# Altium footprint library TarabusLib_KAP.PcbLib: 504 footprints (part 18 of 32)
Each footprint in its own frame and in the unit in brackets; x right, y up, seen from the top. Pads: shape width x height; smd on the part's side, far side on the other; paste and mask are expansions set on the pad; w line width, h text height; cw(c..) or ccw(c..) is an arc to the next point about the centre after c.
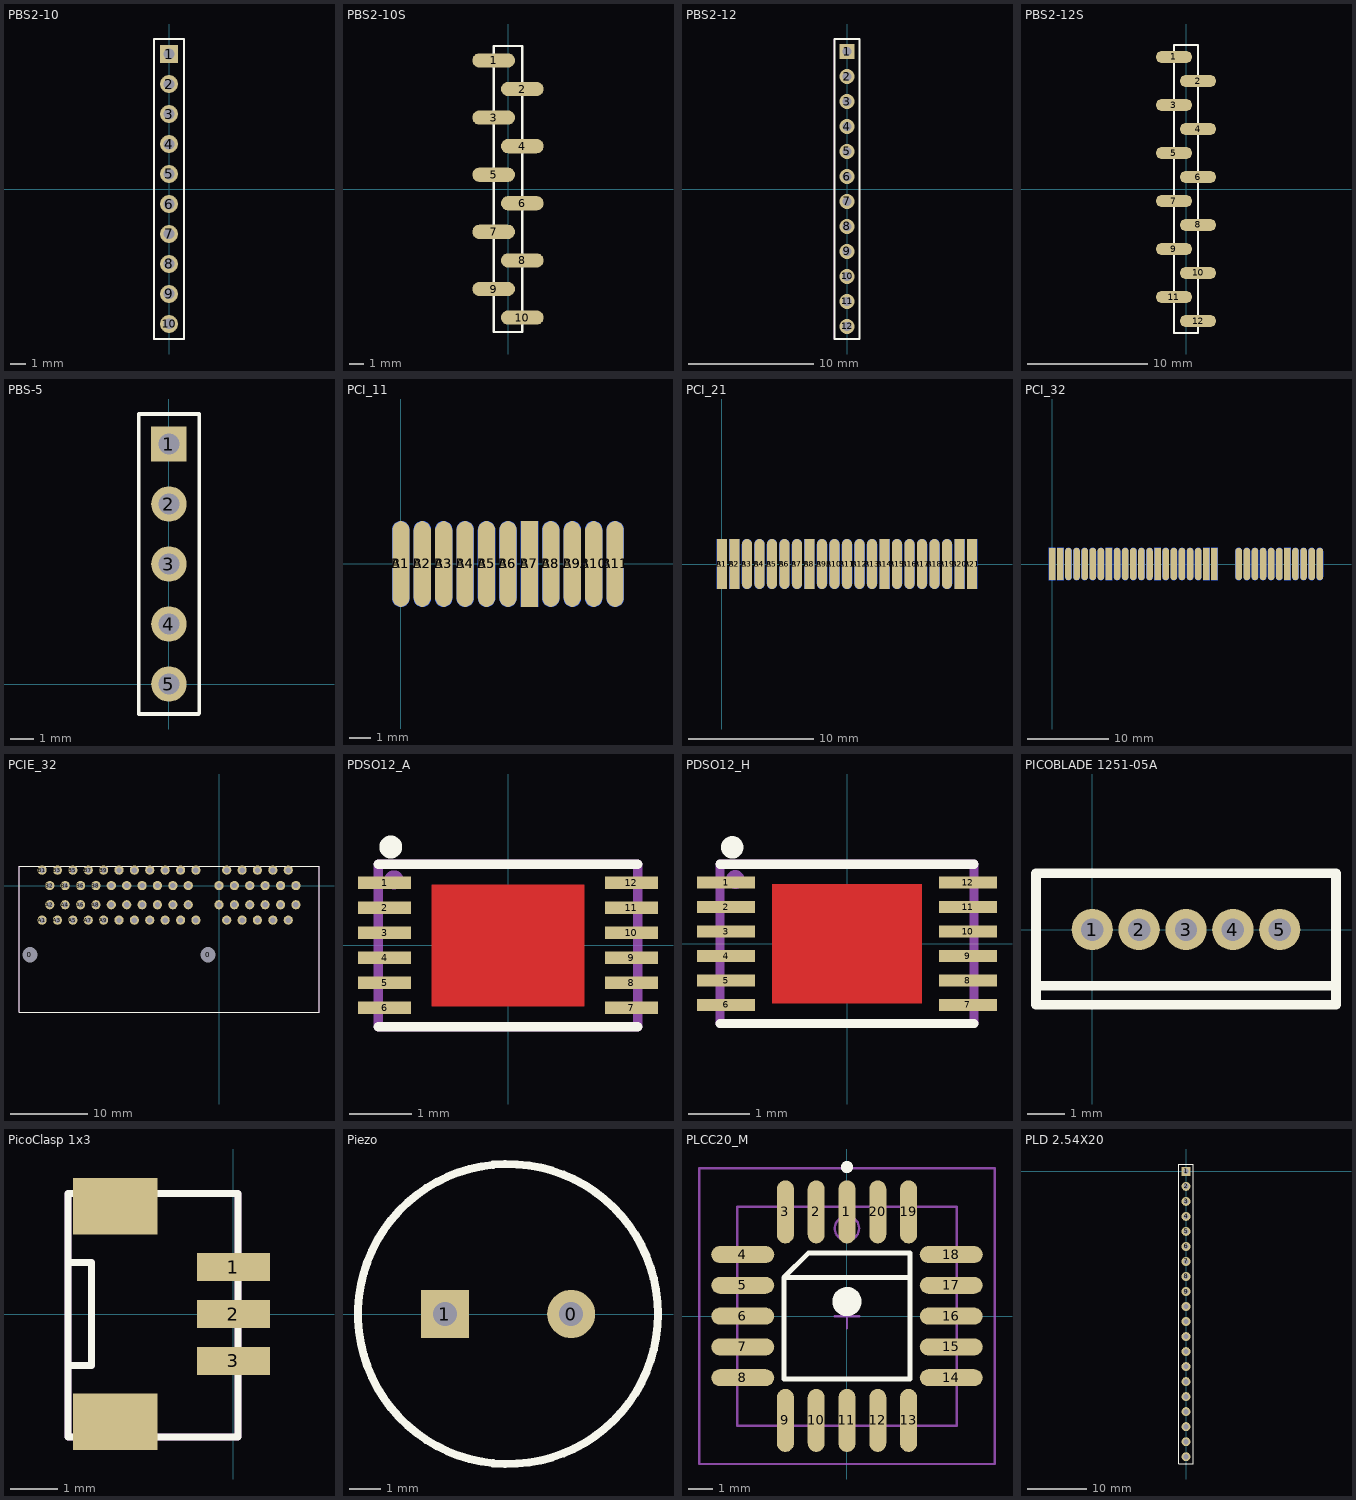
[diagram p17: the footprints below, top view; thin cyan lines are the x and y axes]

## PBS2-10 [mm]
height 4.5
pads (10):
  rect 1.2x1.2 hole 0.7: 1(0,9)
  round 1.2 hole 0.7: 2(0,7) 3(0,5) 4(0,3) 5(0,1) 6(0,-1) 7(0,-3) 8(0,-5) 9(0,-7) 10(0,-9)
Top Overlay:
  lines w0.15: -1,-10 -1,10 1,10 1,-10 -1,-10
Mechanical 7:
  lines w0.1: -1,-10 1,-10 1,10 -1,10 -1,-10
Mechanical 10:
  text ".Comment" at -0.575,10.475 h0.6
  text ".Designator" at -0.575,11.15 h0.8
3D body: height 4.5, standoff 0, extent -1,-10 1,10

## PBS2-10S [mm]
height 4.5
pads (10):
  oval 3x1 smd: 1(-1,9) 2(1,7) 3(-1,5) 4(1,3) 5(-1,1) 6(1,-1) 7(-1,-3) 8(1,-5) 9(-1,-7) 10(1,-9)
Top Overlay:
  lines w0.15: -1,-10 -1,10 1,10 1,-10 -1,-10
Mechanical 7:
  lines w0.1: -1,-10 1,-10 1,10 -1,10 -1,-10
Mechanical 10:
  text ".Comment" at -0.575,10.475 h0.6
  text ".Designator" at -0.575,11.15 h0.8
3D body: height 4.5, standoff 0, extent -1,-10 1,10

## PBS2-12 [mm]
height 4.5
pads (12):
  rect 1.2x1.2 hole 0.7: 1(0,11)
  round 1.2 hole 0.7: 2(0,9) 3(0,7) 4(0,5) 5(0,3) 6(0,1) 7(0,-1) 8(0,-3) 9(0,-5) 10(0,-7) 11(0,-9) 12(0,-11)
Top Overlay:
  lines w0.15: -1,-12 1,-12 1,12 -1,12 -1,-12
Mechanical 7:
  lines w0.1: -1,-12 1,-12 1,12 -1,12 -1,-12
Mechanical 10:
  text ".Designator" at -0.575,13.15 h0.8
  text ".Comment" at -0.575,12.475 h0.6
3D body: height 4.5, standoff 0, extent -1,-12 1,12

## PBS2-12S [mm]
height 4.5
pads (12):
  oval 3x1 smd: 1(-1,11) 2(1,9) 3(-1,7) 4(1,5) 5(-1,3) 6(1,1) 7(-1,-1) 8(1,-3) 9(-1,-5) 10(1,-7) 11(-1,-9) 12(1,-11)
Top Overlay:
  lines w0.15: -1,-12 -1,12 1,12 1,-12 -1,-12
Mechanical 7:
  lines w0.1: -1,-12 -1,12 1,12 1,-12 -1,-12
Mechanical 10:
  text ".Comment" at -0.575,12.475 h0.6
  text ".Designator" at -0.575,13.15 h0.8
3D body: height 4.5, standoff 0, extent -1,-12 1,12

## PBS-5 [mm]
height 8.4
pads (5):
  rect 1.5x1.5 hole 0.9: 1(0,10.16)
  round 1.5 hole 0.9: 2(0,7.62) 3(0,5.08) 4(0,2.54) 5(0,0)
Top Overlay:
  lines w0.15: -1.27,-1.27 1.27,-1.27 ; -1.27,-1.245 -1.27,11.43 1.275,11.43 1.275,-1.245
Mechanical 7:
  lines w0.1: -1.27,-1.245 1.275,-1.245 1.275,11.43 -1.27,11.43 -1.27,-1.245
Mechanical 10:
  text ".Comment" at 0.84,11.97 h0.6
  text ".Designator" at 0.73,12.7 h0.8
3D body "User Library-RM254_5pin.step": height 6.02, standoff -3.1, extent -1.265,-1.27 1.275,11.43

## PCI_11 [mm]
pads (22):
  oval 0.8x4 smd: A1(0,0) A2(1,0) A3(2,0) A4(3,0) A5(4,0) A6(5,0) A8(7,0) A9(8,0) A10(9,0) A11(10,0)
  rect 0.8x4 smd: A7(6,0)
  oval 0.8x4 smd far side: B1(0,0) B2(1,0) B3(2,0) B4(3,0) B5(4,0) B6(5,0) B8(7,0) B9(8,0) B10(9,0) B11(10,0)
  rect 0.8x4 smd far side: B7(6,0)

## PCI_21 [mm]
pads (42):
  rect 0.8x4 smd: A1(0,0) A2(1,0) A8(7,0) A14(13,0) A20(19,0) A21(20,0)
  oval 0.8x4 smd: A3(2,0) A4(3,0) A5(4,0) A6(5,0) A7(6,0) A9(8,0) A10(9,0) A11(10,0) A12(11,0) A13(12,0) A15(14,0) A16(15,0) A17(16,0) A18(17,0) A19(18,0)
  rect 0.8x4 smd far side: B1(0,0) B2(1,0) B8(7,0) B14(13,0) B20(19,0) B21(20,0)
  oval 0.8x4 smd far side: B3(2,0) B4(3,0) B5(4,0) B6(5,0) B7(6,0) B9(8,0) B10(9,0) B11(10,0) B12(11,0) B13(12,0) B15(14,0) B16(15,0) B17(16,0) B18(17,0) B19(18,0)

## PCI_32 [mm]
pads (64):
  rect 0.8x4 smd: A1(0,0) A2(1,0) A8(7,0) A14(13,0) A20(19,0) A21(20,0) A28(29,0)
  oval 0.8x4 smd: A3(2,0) A4(3,0) A5(4,0) A6(5,0) A7(6,0) A9(8,0) A10(9,0) A11(10,0) A12(11,0) A13(12,0) A15(14,0) A16(15,0) A17(16,0) A18(17,0) A19(18,0) A22(23,0) A23(24,0) A24(25,0) A25(26,0) A26(27,0) A27(28,0) A29(30,0) A30(31,0) A31(32,0) A32(33,0)
  rect 0.8x4 smd far side: B1(0,0) B2(1,0) B8(7,0) B14(13,0) B20(19,0) B21(20,0) B28(29,0)
  oval 0.8x4 smd far side: B3(2,0) B4(3,0) B5(4,0) B6(5,0) B7(6,0) B9(8,0) B10(9,0) B11(10,0) B12(11,0) B13(12,0) B15(14,0) B16(15,0) B17(16,0) B18(17,0) B19(18,0) B22(23,0) B23(24,0) B24(25,0) B25(26,0) B26(27,0) B27(28,0) B29(30,0) B30(31,0) B31(32,0) B32(33,0)

## PCIE_32 [mm]
pads (66):
  round 1.2 hole 2: 0(-24.575,-9) 0(-1.425,-9)
  round 1.2 hole 0.7: A1(-23,-4.5) A2(-22,-2.5) A3(-21,-4.5) A4(-20,-2.5) A5(-19,-4.5) A6(-18,-2.5) A7(-17,-4.5) A8(-16,-2.5) A9(-15,-4.5) A10(-14,-2.5) A11(-13,-4.5) A12(-12,-2.5) A13(-11,-4.5) A14(-10,-2.5) A15(-9,-4.5) A16(-8,-2.5) A17(-7,-4.5) A18(-6,-2.5) A19(-5,-4.5) A20(-4,-2.5) A21(-3,-4.5) A22(0,-2.5) A23(1,-4.5) A24(2,-2.5) A25(3,-4.5) A26(4,-2.5) A27(5,-4.5) A28(6,-2.5) A29(7,-4.5) A30(8,-2.5) A31(9,-4.5) A32(10,-2.5) B1(-23,2) B2(-22,0) B3(-21,2) B4(-20,0) B5(-19,2) B6(-18,0) B7(-17,2) B8(-16,0) B9(-15,2) B10(-14,0) B11(-13,2) B12(-12,0) B13(-11,2) B14(-10,0) B15(-9,2) B16(-8,0) B17(-7,2) B18(-6,0) B19(-5,2) B20(-4,0) B21(-3,2) B22(0,0) B23(1,2) B24(2,0) B25(3,2) B26(4,0) B27(5,2) B28(6,0) B29(7,2) B30(8,0) B31(9,2) B32(10,0)
Top Overlay:
  lines w0.1: -26,-16.5 13,-16.5 13,2.5 -26,2.5 -26,-16.5
Mechanical 7:
  lines w0.1: -26,-16.5 -26,2.5 13,2.5 13,-16.5 -26,-16.5
3D body: height 9.45, standoff 0, extent -26,-16.5 13,-6
3D body: height 8, standoff 0, extent -26,-6 13,2.5

## PDSO12_A [mm]
pads (12):
  rect 0.85x0.2 smd: 1(-1.975,1) 2(-1.975,0.6) 3(-1.975,0.2) 4(-1.975,-0.2) 5(-1.975,-0.6) 6(-1.975,-1) 7(1.975,-1) 8(1.975,-0.6) 9(1.975,-0.2) 10(1.975,0.2) 11(1.975,0.6) 12(1.975,1)
Top Layer:
  rectangle: -1.225,-0.975 1.225,0.975
Top Overlay:
  circle w0.254: c-1.875,1.575 r0.056
  lines w0.15: -2.075,-1.3 2.075,-1.3 ; -2.075,1.3 2.075,1.3
Mechanical 7:
  circle w0.254: c-1.825,1.05 r0.025
  lines w0.15: -2.075,-1.3 -2.075,1.3 2.075,1.3 2.075,-1.3 -2.075,-1.3
Mechanical 10:
  text ".Designator" at 0.575,2.1 h0.8
  text ".Comment" at 0.525,1.575 h0.6
3D body "PDSO12.STEP": height 1, standoff 0, extent -2.075,-1.3 2.075,1.3

## PDSO12_H [mm]
pads (12):
  rect 0.95x0.2 smd: 1(-1.975,1) 2(-1.975,0.6) 3(-1.975,0.2) 4(-1.975,-0.2) 5(-1.975,-0.6) 6(-1.975,-1) 7(1.975,-1) 8(1.975,-0.6) 9(1.975,-0.2) 10(1.975,0.2) 11(1.975,0.6) 12(1.975,1)
Top Layer:
  rectangle: -1.225,-0.975 1.225,0.975
Top Overlay:
  circle w0.254: c-1.875,1.575 r0.056
  lines w0.15: -2.075,-1.3 2.075,-1.3 ; -2.075,1.3 2.075,1.3
Mechanical 7:
  circle w0.254: c-1.825,1.05 r0.025
  lines w0.15: -2.075,-1.3 2.075,-1.3 2.075,1.3 -2.075,1.3 -2.075,-1.3
Mechanical 10:
  text ".Comment" at 0.525,1.575 h0.6
  text ".Designator" at 0.575,2.1 h0.8
3D body "PDSO12.STEP": height 1, standoff 0, extent -2.075,-1.3 2.075,1.3

## PICOBLADE 1251-05A [mm]
pads (5):
  round 1.1 hole 0.6 mask+0: 1(0,0) 2(1.25,0) 3(2.5,0) 4(3.75,0) 5(5,0)
Top Overlay:
  lines w0.254: -1.5,-1.5 6.5,-1.5 ; -1.5,-2 -1.5,1.5 6.5,1.5 6.5,-2 -1.5,-2

## PicoClasp 1x3 [mm]
pads (5):
  rect 1.55x0.6 smd: 1(0,1) 2(0,0) 3(0,-1)
  rect 1.8x1.2 smd: ""(-2.525,-2.3) ""(-2.525,2.3)
Top Overlay:
  lines w0.15: -3.525,-1.1 -3.025,-1.1 -3.025,1.1 -3.525,1.1 ; -3.525,-2.625 -3.525,2.575 0.1,2.575 0.1,-2.625 -3.525,-2.625
Mechanical 7:
  lines w0.15: -3.525,-1.075 -3.5,-1.1 -3.025,-1.1 -3.025,1.1 -3.525,1.1 ; -3.525,-2.625 -3.525,2.575 0.1,2.575 0.1,-2.625 -3.525,-2.625
Mechanical 10:
  text ".Comment" at -4,4 h0.6
  text ".Designator" at -4,5 h0.6
3D body "5013310307.stp": height 5.45, standoff 0, extent -3.5,-2.62 0.1,2.62

## Piezo [mil]
pads (2):
  round 60 hole 30: 0(-196.85,0)
  rect 60x60 hole 30: 1(-354.33,0)
Top Overlay:
  circle w10: c-275.59,0 r187.01
3D body "HC0903F.STEP": height 268.11, standoff -145.67, extent -462.59,-187 -88.58,187.01

## PLCC20_M [mm] "20-Pin Leaded Chip Carrier 1.27 mm Pitch, IPC Low Density"
height 4.57
pads (20):
  oval 0.7x2.6 smd: 1(0,4.3) 2(-1.27,4.3) 3(-2.54,4.3) 9(-2.54,-4.3) 10(-1.27,-4.3) 11(0,-4.3) 12(1.27,-4.3) 13(2.54,-4.3) 19(2.54,4.3) 20(1.27,4.3)
  oval 2.6x0.7 smd: 4(-4.3,2.54) 5(-4.3,1.27) 6(-4.3,0) 7(-4.3,-1.27) 8(-4.3,-2.54) 14(4.3,-2.54) 15(4.3,-1.27) 16(4.3,0) 17(4.3,1.27) 18(4.3,2.54)
Top Overlay:
  circle w0.25: c0,6.15 r0.125
  circle w0.6: c0,0.6 r0.3
  lines w0.2: 2.6,1.6 -2.6,1.6 ; -2.6,1.6 -1.6,2.6 2.6,2.6 2.6,-2.6 -2.6,-2.6 -2.6,1.6
Mechanical 13:
  circle w0.1: c0,3.62 r0.5
  lines w0.1: -4.52,-4.52 -4.52,4.52 4.52,4.52 4.52,-4.52 -4.52,-4.52
Mechanical 15:
  lines w0.1: -0.5,0 0.5,0 ; 0,-0.5 0,0.5 ; -6.1,-6.1 -6.1,6.1 6.1,6.1 6.1,-6.1 -6.1,-6.1
3D body: height 4.57, standoff 0, extent -4.52,-4.52 4.52,4.52

## PLD 2.54X20 [mm]
pads (20):
  rect 1.5x1.5 hole 0.9: 1(0,0)
  round 1.5 hole 0.9: 2(0,-2.54) 3(0,-5.08) 4(0,-7.62) 5(0,-10.16) 6(0,-12.7) 7(0,-15.24) 8(0,-17.78) 9(0,-20.32) 10(0,-22.86) 11(0,-25.4) 12(0,-27.94) 13(0,-30.48) 14(0,-33.02) 15(0,-35.56) 16(0,-38.1) 17(0,-40.64) 18(0,-43.18) 19(0,-45.72) 20(0,-48.26)
Top Overlay:
  lines w0.15: -1.25,-49.5 -1.25,1.25 1.25,1.25 1.25,-49.5 -1.25,-49.5
3D body: height 5, standoff 1, extent -1.25,-49.5 1.25,1.25